# Altium footprint library rus.PcbLib: 83 footprints (part 3 of 6)
Each footprint in its own frame and in the unit in brackets; x right, y up, seen from the top. Pads: shape width x height; smd on the part's side, far side on the other; paste and mask are expansions set on the pad; w line width, h text height; cw(c..) or ccw(c..) is an arc to the next point about the centre after c.
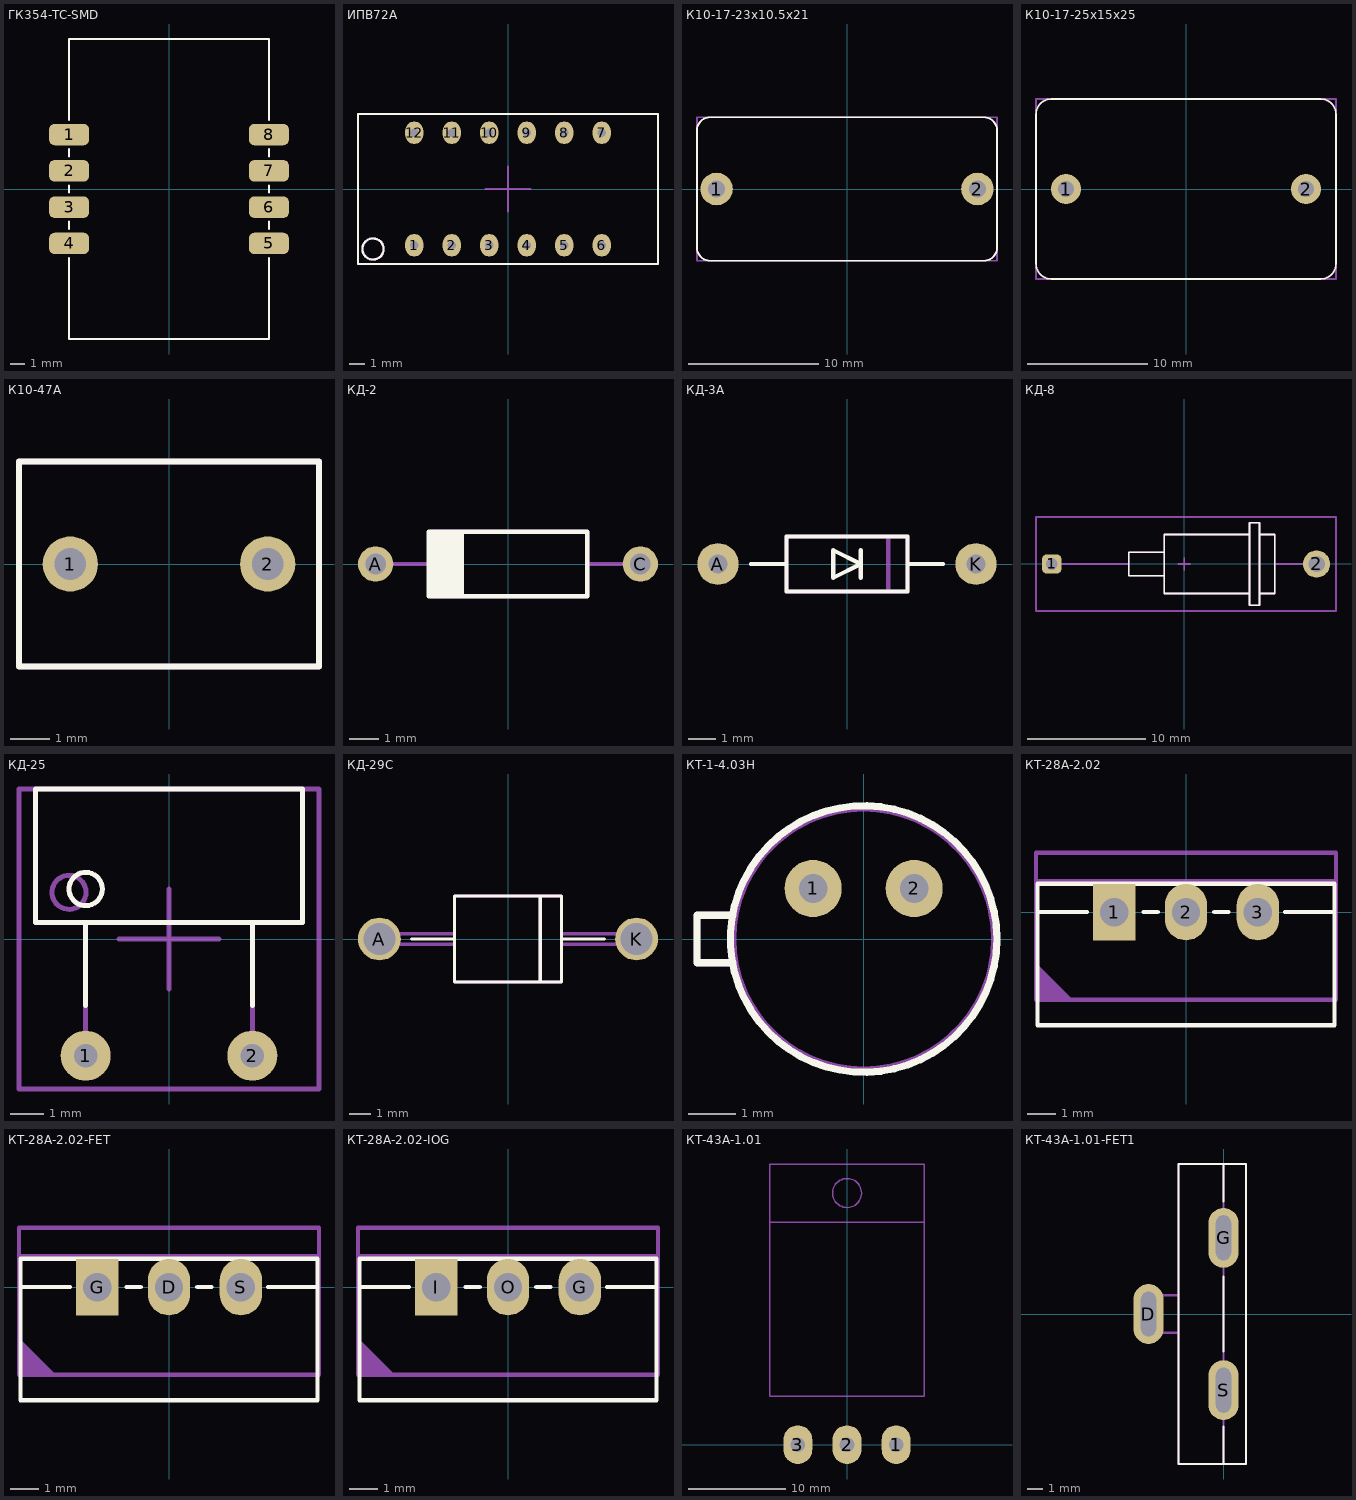
[diagram p2: the footprints below, top view; thin cyan lines are the x and y axes]

## ГК354-ТС-SMD [mm] "ГК354-ТС-SMD"
height 7.7
pads (8):
  rrect50% 2.8x1.5 smd mask+0.05: 1(-7,3.81) 2(-7,1.27) 3(-7,-1.27) 4(-7,-3.81) 5(6.98,-3.81) 6(6.98,-1.27) 7(6.98,1.27) 8(6.98,3.81)
Top Overlay:
  lines w0.15: -7.02,-4.835 -7.02,-10.5 6.98,-10.5 6.98,-4.835 ; -7.02,-2.785 -7.02,-2.295 ; -7.02,-0.245 -7.02,0.245 ; -7.02,2.295 -7.02,2.785 ; -7.02,4.835 -7.02,10.5 6.98,10.5 6.98,4.835 ; 6.98,-2.785 6.98,-2.295 ; 6.98,-0.245 6.98,0.245 ; 6.98,2.295 6.98,2.785
  text "." at -8.091,5.112 h0.1
3D body: height 0.5, standoff 0, extent -7,-10.5 7,10.5
3D body: height 7.5, standoff 0, extent -6,-9.5 6,9.5

## ИПВ72А [mm]
height 8
pads (12):
  oval 1.2x1.5 hole 0.6: 1(-6.25,-3.75) 2(-3.75,-3.75) 3(-1.25,-3.75) 4(1.25,-3.75) 5(3.75,-3.75) 6(6.25,-3.75) 7(6.25,3.75) 8(3.75,3.75) 9(1.25,3.75) 10(-1.25,3.75) 11(-3.75,3.75) 12(-6.25,3.75)
Top Overlay:
  circle w0.15: c-9,-4 r0.707
  lines w0.15: -10,-5 -10,5 10,5 10,-5 -10,-5
Mechanical 15:
  lines w0.15: -1.5,0 1.5,0 ; 0,-1.5 0,1.5
Mechanical 29:
  circle w0.15: c-9,-4 r0.707
  lines w0.15: -10,-5 -10,5 10,5 10,-5 -10,-5
  text ".Designator" at -3.8,-0.3 h1
3D body "ИПВ72А.STEP": height 6, standoff -4.5, extent -10,-5 10,5

## К10-17-23х10.5х21 [mm]
height 23
pads (2):
  round 2.5 hole 1.3 unplated: 1(-10,0) 2(10,0)
Top Overlay:
  lines w0.15: -11.5,-4.5 ccw(c-10.5,-4.5) -10.5,-5.5 10.5,-5.5 ccw(c10.5,-4.5) 11.5,-4.5 11.5,4.5 ccw(c10.5,4.5) 10.5,5.5 -10.5,5.5 ccw(c-10.5,4.5) -11.5,4.5 -11.5,-4.5
Mechanical 29:
  lines w0.15: -11.5,-5.5 11.5,-5.5 11.5,5.5 -11.5,5.5 -11.5,-5.5
  text ".Designator" at -2.7,-0.4 h1
3D body: height 23, standoff 2, extent -11.499,-5.499 11.499,5.499

## К10-17-25х15х25 [mm]
height 27
pads (2):
  round 2.5 hole 1.3 unplated: 1(-10,0) 2(10,0)
Top Overlay:
  lines w0.15: -12.5,-6.23 ccw(c-11.23,-6.23) -11.23,-7.5 0,-7.5 11.23,-7.5 ccw(c11.23,-6.23) 12.5,-6.23 12.5,0 12.5,6.23 ccw(c11.23,6.23) 11.23,7.5 0,7.5 -11.23,7.5 ccw(c-11.23,6.23) -12.5,6.23 -12.5,0 -12.5,-6.23
Mechanical 29:
  lines w0.15: -12.5,-7.5 -12.5,7.5 12.5,7.5 12.5,-7.5 -12.5,-7.5
  text ".Designator" at -3.1,-0.3 h1
3D body: height 27, standoff 2, extent -12.499,-7.499 12.499,7.499

## К10-47А [mm] "7.5x5.3x5"
height 21
pads (2):
  round 1.4 hole 0.8: 1(-2.5,0) 2(2.5,0)
Top Overlay:
  lines w0.15: -3.8,-2.6 -3.8,2.6 3.8,2.6 3.8,-2.6 -3.8,-2.6
Mechanical 1:
  lines w0.15: -3.8,-2.6 -3.8,2.6 3.8,2.6 3.8,-2.6 -3.8,-2.6
Mechanical 29:
  lines w0.15: -3.8,-2.6 3.8,-2.6 3.8,2.6 -3.8,2.6 -3.8,-2.6
  text ".Designator" at -2.7,-0.3 h1
3D body "CPLP5mm5v4.STEP": height 7, standoff -2.6, extent -3.6,-2.7 3.6,2.7

## КД-2 [mm]
pads (2):
  round 1.2 hole 0.7: A(-4.5,0) C(4.5,0)
Top Overlay:
  rectangle: -2.7,-1.1 -1.5,1.1
  lines w0.15: -2.7,-1.1 2.7,-1.1 2.7,1.1 -2.6,1.1 -2.7,1.1 -2.7,-1.1
Mechanical 29:
  rectangle: -2.6,-1.1 -1.9,1.1
  lines w0.15: -4.5,0 -2.6,0 ; 2.7,0 4.5,0 ; -2.6,-1.1 2.7,-1.1 2.7,1.1 -2.6,1.1 -2.6,-1.1
  text ".Designator" at -1.5,-0.4 h1
3D body: height 2.39, standoff 0.2, extent -2.291,-1.098 2.209,1.098

## КД-3А [mm] "КД-3А диод/стабилистрон"
height 2
pads (2):
  oval 1.5x1.52 hole 0.7: A(-4.7,0) K(4.7,0)
Top Overlay:
  lines w0.15: -3.5,0 -2.2,0 ; 0.5,-0.5 0.5,0.5 ; 2.2,0 3.5,0 ; -2.2,-1 2.2,-1 2.2,1 -2.2,1 -2.2,-1 ; -0.5,-0.5 -0.5,0.5 0.5,0 -0.5,-0.5
Mechanical 29:
  lines w0.15: -3.5,0 -2.2,0 ; 1.5,-1 1.5,1 ; 2.2,0 3.5,0 ; -2.2,-1 2.2,-1 2.2,1 -2.2,1 -2.2,-1
  text ".Designator" at -1.9,-0.5 h1

## КД-8 [mm] "Pitch 22.5mm"
height 7
pads (2):
  rrect50% 1.65x1.65 hole 1: 1(-11.25,0)
  round 2.3 hole 1.4: 2(11.25,0)
Top Overlay:
  lines w0.15: -1.7,-1 -4.7,-1 -4.7,1 -1.7,1 ; 5.55,-2.5 -1.7,-2.5 -1.7,2.5 5.55,2.5 ; 6.4,-2.5 7.7,-2.5 7.7,2.5 6.4,2.5 ; 5.55,-3.5 6.4,-3.5 6.4,3.5 5.55,3.5 5.55,-3.5
Mechanical 15:
  lines w0.15: -0.5,0 0.5,0 ; 0,-0.5 0,0.5 ; -12.59,-4 -12.59,4 12.9,4 12.9,-4 -12.59,-4
Mechanical 29:
  lines w0.15: -11.2,0 -4.7,0 ; -1.7,-1 -4.7,-1 -4.7,1 -1.7,1 ; 5.55,-2.5 -1.7,-2.5 -1.7,2.5 5.55,2.5 ; 6.4,-2.5 7.7,-2.5 7.7,2.5 6.4,2.5 ; 7.7,0 11.2,0 ; 5.55,-3.5 5.55,3.5 6.4,3.5 6.4,-3.5 5.55,-3.5
  text ".Designator" at -1.1,-0.5 h1
3D body "КД-8.STEP": height 7, standoff -3, extent -11.6,-3.493 11.8,3.493

## КД-25 [mm]
height 4
pads (2):
  round 1.5 hole 0.7: 1(-2.5,-3.5) 2(2.5,-3.5)
Top Overlay:
  circle w0.15: c-2.5,1.5 r0.5
  lines w0.15: -2.5,-2 -2.5,0.5 ; 2.5,-2 2.5,0.5 ; -4,0.5 4,0.5 4,4.5 -4,4.5 -4,0.5
Mechanical 15:
  lines w0.15: -1.5,0 1.5,0 ; 0,-1.5 0,1.5 ; -4.5,-4.5 -4.5,4.5 4.5,4.5 4.5,-4.5 -4.5,-4.5
Mechanical 29:
  circle w0.15: c-3,1.4 r0.51
  lines w0.15: -2.5,-3.5 -2.5,0.5 ; 2.5,-3.5 2.5,0.5 ; -4,0.5 -4,4.5 4,4.5 4,0.5 -4,0.5
  text ".Designator" at -3.4,2.6 h1
3D body "КД-25.STEP": height 4, standoff -3, extent -4,-3.765 4,4.5

## КД-29С [mm]
height 5
pads (2):
  round 2 hole 1.5: A(-6,0) K(6,0)
Top Overlay:
  lines w0.15: -4.5,0 -2.5,0 ; 1.5,-2 1.5,2 ; 4.5,0 2.5,0 ; 2.5,0 2.5,-2 -2.5,-2 -2.5,2 2.5,2 2.5,0
Mechanical 29:
  lines w0.15: 1.5,-2 1.5,2 ; 2.5,-0.25 6,-0.25 6,0.25 2.5,0.25 ; -6,-0.25 -6,0.25 -2.5,0.25 -2.5,-0.25 -6,-0.25 ; -2.5,-2 -2.5,2 2.5,2 2.5,-2 -2.5,-2
  text ".Designator" at -2.3,-0.4 h1
3D body: height 4.3, standoff 0.7, extent -2.25,-1.799 2.15,1.8

## КТ-1-4.03Н [mm]
height 20
pads (2):
  round 1.2 hole 0.6: 1(-1.061,1.061) 2(1.061,1.061)
Top Overlay:
  circle w0.15: c0,0 r2.8
  lines w0.15: -2.75,-0.5 -3,-0.5 -3.5,-0.5 -3.5,0.5 -3,0.5 -2.75,0.5
Mechanical 29:
  circle w0.15: c0,0 r2.75
  lines w0.15: -2.75,-0.5 -3.5,-0.5 -3.5,0.5 -2.75,0.5
  text ".Designator" at -2.3,-0.4 h1
3D body: height 11, standoff -4, extent -1.259,0.861 -0.86,1.26
3D body: height 11, standoff -4, extent 0.862,0.861 1.261,1.26
3D body: height 15, standoff 10, extent -2.4,-2.399 2.4,2.399
3D body: height 10.5, standoff 10, extent -3.501,-2.801 2.801,2.801

## КТ-28А-2.02 [mm]
pads (3):
  rect 1.5x2 hole 1: 1(-2.54,0)
  oval 1.5x2 hole 1: 2(0,0) 3(2.54,0)
Top Overlay:
  lines w0.15: -5.25,0 -3.5,0 ; -1.5,0 -1,0 ; 1,0 1.5,0 ; 3.5,0 5.25,0 ; -5.25,-4 -5.25,-0.25 -5.25,1 5.25,1 5.25,-0.25 5.25,-4 0,-4 -5.25,-4
Mechanical 29:
  region: -5.3,-1.8 -5.3,-3.1 -4,-3.1
  lines w0.15: -5.3,1.1 5.3,1.1 ; -5.3,-3.1 5.3,-3.1 5.3,2.1 -5.3,2.1 -5.3,-3.1
  text ".Designator" at -3.7,-1.1 h1
3D body "KT-28F-2_02_6_5mm.step": height 22.5, standoff -2.5, extent -5.4,-3 5.4,2.2

## КТ-28А-2.02-FET [mm]
pads (3):
  oval 1.5x2 hole 1: D(0,0) S(2.54,0)
  rect 1.5x2 hole 1: G(-2.54,0)
Top Overlay:
  lines w0.15: -5.25,0 -3.5,0 ; -1.5,0 -1,0 ; 1,0 1.5,0 ; 3.5,0 5.25,0 ; -5.25,-4 0,-4 5.25,-4 5.25,-0.25 5.25,1 -5.25,1 -5.25,-0.25 -5.25,-4
Mechanical 29:
  region: -5.3,-1.8 -5.3,-3.1 -4,-3.1
  lines w0.15: -5.3,1.1 5.3,1.1 ; -5.3,-3.1 -5.3,2.1 5.3,2.1 5.3,-3.1 -5.3,-3.1
  text ".Designator" at -3.3,-1.1 h1
3D body "KT-28F-2_02_6_5mm.step": height 22.5, standoff -2.5, extent -5.4,-3 5.4,2.2

## КТ-28А-2.02-IOG [mm]
pads (3):
  oval 1.5x2 hole 1: G(2.54,0) O(0,0)
  rect 1.5x2 hole 1: I(-2.54,0)
Top Overlay:
  lines w0.15: -5.25,0 -3.5,0 ; -1.5,0 -1,0 ; 1,0 1.5,0 ; 3.5,0 5.25,0 ; -5.25,-4 -5.25,-0.25 -5.25,1 5.25,1 5.25,-0.25 5.25,-4 0,-4 -5.25,-4
Mechanical 29:
  region: -5.3,-1.8 -5.3,-3.1 -4,-3.1
  lines w0.15: -5.3,1.1 5.3,1.1 ; -5.3,-3.1 5.3,-3.1 5.3,2.1 -5.3,2.1 -5.3,-3.1
  text ".Designator" at -3.1,-1.2 h1
3D body "KT-28F-2_02_6_5mm.step": height 22.5, standoff -2.5, extent -5.4,-3 5.4,2.2

## КТ-43А-1.01 [mm]
height 5.3
pads (3):
  oval 3x4 hole 1.5: 1(5.08,0) 2(0,0) 3(-5.08,0)
Mechanical 13:
  circle w0.15: c0,26 r1.5
Mechanical 29:
  lines w0.15: -8,23 0,23 8,23 ; -8,5 -8,29 0,29 8,29 8,5 0,5 -8,5
  text ".Designator" at -2.7,14 h1
3D body "КТ-43А-1.01.STEP": height 3, standoff -7.3, extent -7.8,-0.25 7.8,28.75

## КТ-43А-1.01-FET1 [mm]
height 30
pads (3):
  oval 2x4 hole 1 slot 3 at 90 deg: D(-5,0) G(0,5.08) S(0,-5.08)
Top Overlay:
  lines w0.15: 0,-7.5 0,-10 ; 0,-2.5 0,2.5 ; 0,7.5 0,10 ; 0,-10 -3,-10 -3,10 0,10 ; 0,-10 1.5,-10 1.5,-7.5 1.5,7.5 1.5,8.5 1.5,10 0,10
Mechanical 29:
  lines w0.15: -3,-1.25 -5.25,-1.25 -5.25,1.25 -3,1.25 ; 0,-10 0,10 1.5,10 ; 1.5,10 1.5,-10 -3,-10 -3,10 1.5,10
  text ".Designator" at -1,-3.5 h1
3D body "КТ-43А-1.01-flex1.STEP": height 32, standoff -1.4, extent -5.2,-10 1.3,10